# Altium footprint library Library 3D.PcbLib: 288 footprints (part 2 of 18)
Each footprint in its own frame and in the unit in brackets; x right, y up, seen from the top. Pads: shape width x height; smd on the part's side, far side on the other; paste and mask are expansions set on the pad; w line width, h text height; cw(c..) or ccw(c..) is an arc to the next point about the centre after c.
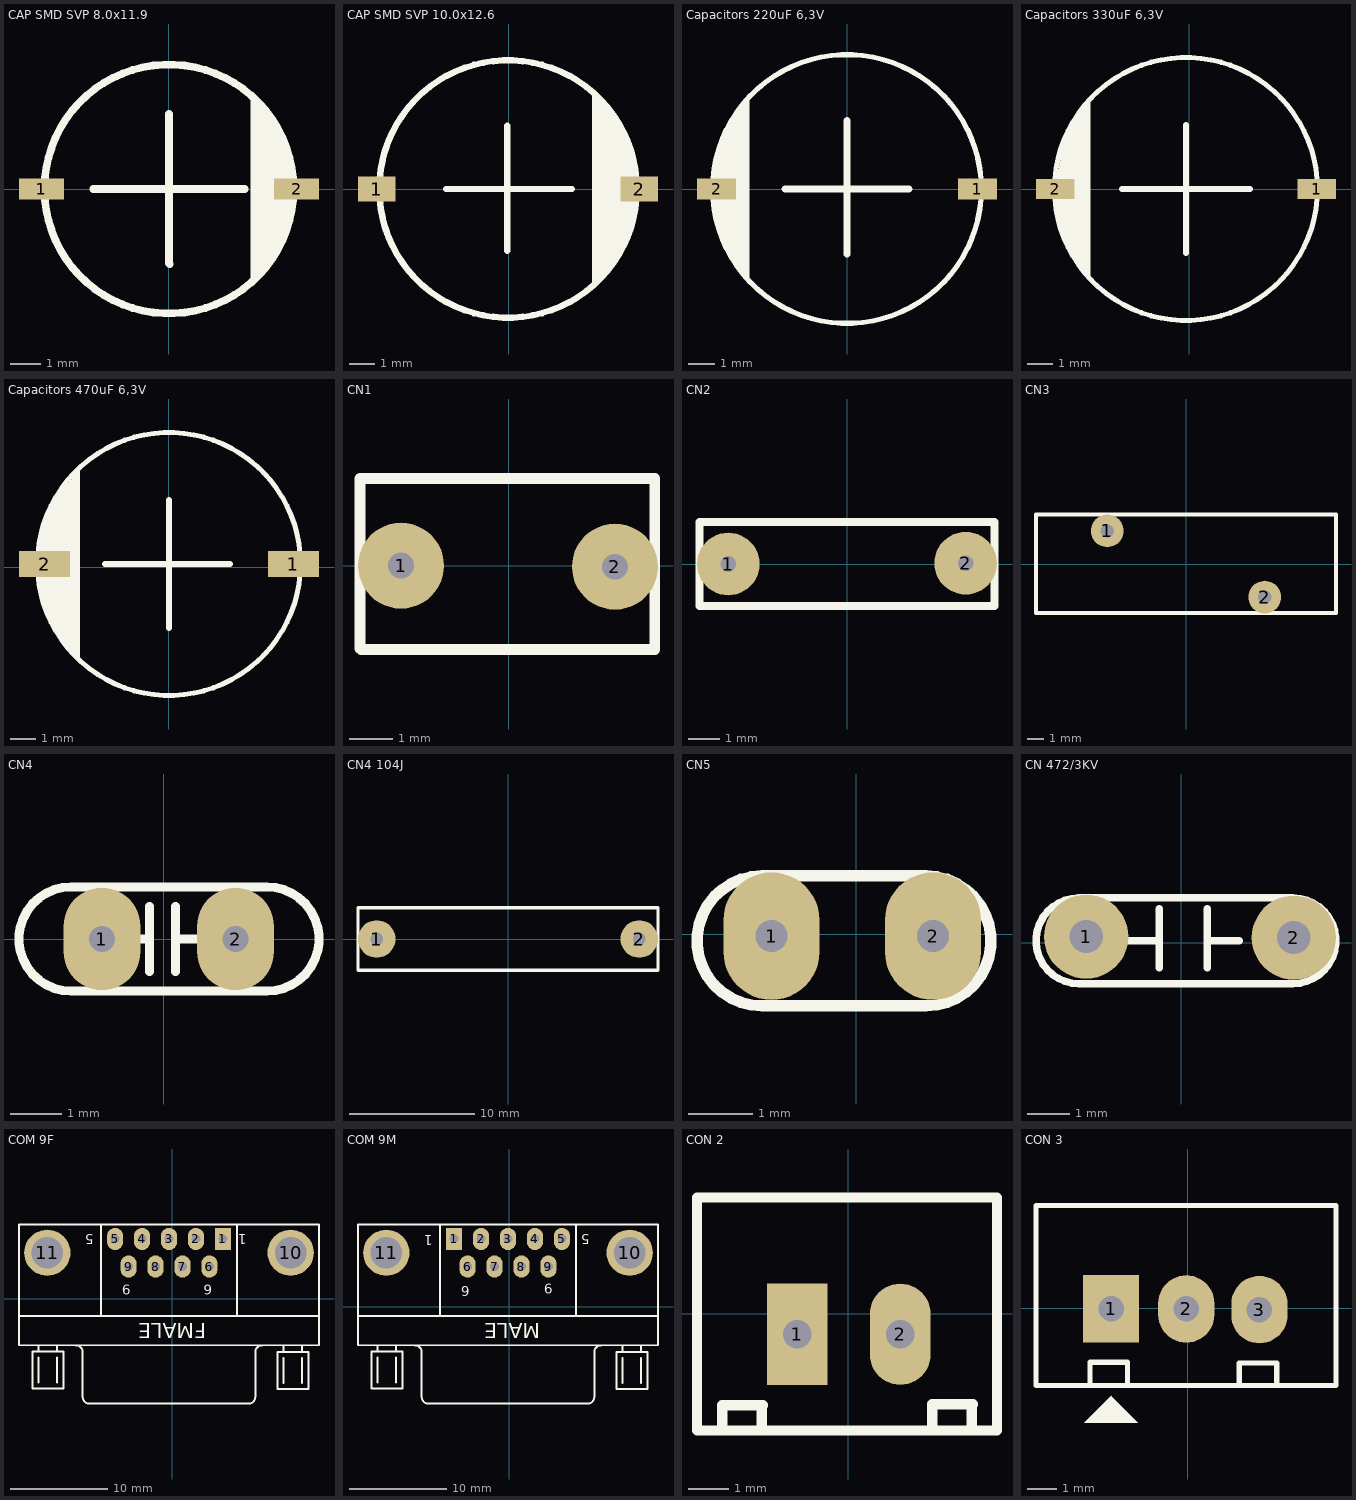
[diagram p1: the footprints below, top view; thin cyan lines are the x and y axes]

## CAP SMD SVP 8.0x11.9 [mm]
pads (2):
  rect 1.5x0.7 smd: 1(-4.25,0) 2(4.25,0)
Top Overlay:
  circle w0.254: c0,0 r4.15
  region: 2.725,3.1 2.725,-3.15 3.375,-2.45 3.875,-1.6 4.1,-0.8 4.153,0.056 4.1,0.85 3.891,1.681 3.375,2.45
  lines w0.254: -2.525,0 2.525,0 ; 0,2.5 0,-2.475 0.025,-2.5
3D body "User Library-CAP SMD SVP 8_0x11_9.STEP": height 11.9, standoff 0, extent -4.5,-4.15 4.5,4.15

## CAP SMD SVP 10.0x12.6 [mm]
pads (2):
  rect 1.5x1 smd: 1(-5.288,0) 2(5.213,0)
Top Overlay:
  circle w0.254: c-0.038,0 r5.15
  region: 3.338,3.8 3.337,-3.85 4.2,-2.987 4.788,-1.925 5.112,0 4.988,1.075 4.688,2.15 4.1,3.037
  lines w0.254: -2.513,0 2.512,0 ; -0.062,-2.475 -0.062,2.525
3D body "User Library-CAP SMD SVP 10_0x12_6.STEP": height 12.6, standoff 0, extent -5.537,-5.15 5.463,5.15

## Capacitors 220uF 6,3V [mm]
pads (2):
  rect 1.5x0.8 smd: 1(5,0) 2(-5,0)
Top Overlay:
  circle w0.2: c0,0 r5.15
  region: -3.75,3.562 -3.75,-3.5 -4.75,-2 -5.25,0 -4.721,1.985
  lines w0.254: -2.375,0 2.375,0 ; 0,-2.5 0,2.625
3D body "User Library-SMD Polymer Aluminum Electrolytic Capacitors F8 220uF 6,3V.STEP": height 7.9, standoff -0.05, extent -5.5,-5.15 5.5,5.15

## Capacitors 330uF 6,3V [mm]
pads (2):
  rect 1.5x0.8 smd: 1(5,0) 2(-5.25,0)
Top Overlay:
  circle w0.2: c-0.125,0 r5.15
  region: -3.875,3.5 -3.875,-3.5 -5,-1.875 -5.25,0 -4.875,2
  lines w0.254: -2.625,0 2.375,0 ; -0.125,-2.5 -0.125,2.5
3D body "User Library-SMD Polymer Aluminum Electrolytic Capacitors F8 330uF 6,3V.STEP": height 7.9, standoff -0.05, extent -5.625,-5.15 5.375,5.15

## Capacitors 470uF 6,3V [mm]
pads (2):
  rect 2x1 smd: 1(4.875,0.125) 2(-4.875,0.125)
Top Overlay:
  circle w0.2: c0,0.125 r5.15
  region: -3.5,-3.562 -3.5,3.812 -4.125,3.063 -4.75,2.188 -5,1.062 -5.15,0.062 -5,-0.937 -4.75,-1.937 -4.25,-2.812
  lines w0.254: -2.5,0.125 2.375,0.125 ; 0,-2.375 0,2.625
3D body "User Library-SMD Polymer Aluminum Electrolytic Capacitors F8 470uF 6,3V.STEP": height 7.9, standoff -0.05, extent -5.5,-5.025 5.5,5.275

## CN1 [mm]
pads (2):
  round 2 hole 0.6: 1(-2.5,0) 2(2.475,-0.025)
Top Overlay:
  lines w0.254: -3.45,-1.925 -3.45,2.025 3.4,2.025 3.4,-1.95 -3.425,-1.95 -3.45,-1.925
3D body "User Library-6mm radial ceramic disc capacitor.STEP": height 8.5, standoff -25.12, extent -3,-1.9 3,1.9

## CN2 [mm]
pads (2):
  round 2 hole 0.5: 1(-3.785,0) 2(3.785,0.025)
Top Overlay:
  lines w0.254: -4.699,-1.346 4.699,-1.346 4.699,1.346 -4.699,1.346 -4.699,-1.346
3D body "SW3dPS-Panasonic ECK-A3D102KBP.STEP": height 9.03, standoff -4.16, extent -4,-1.197 4.001,1.195

## CN3 [mm]
pads (2):
  round 2 hole 0.8: 1(-4.801,2.032) 2(4.801,-2.007)
Top Overlay:
  lines w0.254: -9.15,-2.974 9.15,-2.974 9.15,3.025 -9.15,3.025 -9.15,-2.974
3D body "User Library-440LD68-R.STEP": height 23.5, standoff -26.8, extent -9.15,-2.974 9.15,3.025

## CN4 [mm]
pads (2):
  oval 1.5x2 hole 0.5: 1(-1.205,0) 2(1.395,0)
Top Overlay:
  lines w0.178: -0.789,0 -0.281,0 ; -0.281,-0.635 -0.281,0.635 ; 0.227,-0.635 0.227,0.635 ; 0.227,0 0.735,0 ; -1.805,-1.016 cw(c-1.805,0) -1.805,1.016 2.005,1.016 cw(c2.005,0) 2.005,-1.016 -1.805,-1.016
3D body "cn104.STEP": height 5.97, standoff -1.95, extent -2.817,-0.848 3.021,0.848

## CN4 104J [mm]
pads (2):
  round 3 hole 1: 1(-10.5,0) 2(10.5,0)
Top Overlay:
  lines w0.254: -12,-2.5 12,-2.5 12,2.5 -12,2.5 -12,-2.5
3D body "User Library-cap-21.STEP": height 13, standoff -4, extent -11,-2.5 11,2.5

## CN5 [mm]
pads (2):
  oval 1.5x2 hole 0.5: 1(-1.325,-0.025) 2(1.2,-0.025)
Top Overlay:
  lines w0.178: 1.065,-1.116 -1.475,-1.116 cw(c-1.475,-0.1) -1.475,0.916 1.065,0.916 ; 1.09,-1.116 ccw(c1.09,-0.1) 1.09,0.916
3D body "SW3dPS-Cap 100n.STEP": height 6.73, standoff -1.19, extent -2.997,-0.862 2.841,0.834

## CN 472/3KV [mm]
pads (2):
  round 2 hole 0.787: 1(-2.25,0.15) 2(2.675,0.125)
Top Overlay:
  lines w0.178: -1.282,0.05 -0.52,0.05 ; -0.52,-0.585 -0.52,0.812 ; 0.623,-0.585 0.623,0.812 ; 0.623,0.05 1.385,0.05 ; -2.425,-0.966 cw(c-2.425,0.05) -2.425,1.066 2.655,1.066 cw(c2.655,0.05) 2.655,-0.966 -2.425,-0.966
3D body "tu hoa 5mm.step": height 10.35, standoff -2.22, extent -3.809,-1.073 4.191,1.437

## COM 9F [mm]
pads (11):
  rect 1.651x2.286 hole 0.889: 1(5.215,6.12)
  oval 1.651x2.286 hole 0.889: 2(2.445,6.12) 3(-0.325,6.12) 4(-3.095,6.12) 5(-5.865,6.12) 6(3.83,3.28) 7(1.06,3.28) 8(-1.71,3.28) 9(-4.48,3.28)
  round 4.76 hole 3.26: 10(12.17,4.7) 11(-12.82,4.7)
Top Overlay:
  lines w0.2: -15.725,-1.8 15.075,-1.8 ; -9.885,-4.805 cw(c-9.885,-5.5) -9.19,-5.5 -9.19,-10.1 ; -9.185,-10.105 ccw(c-8.49,-10.105) -8.49,-10.8 7.84,-10.8 ccw(c7.84,-10.105) 8.535,-10.105 ; -7.325,-1.8 -7.325,7.6 ; 6.675,-1.8 6.675,7.6 ; 8.54,-10.1 8.54,-5.5 cw(c9.235,-5.5) 9.235,-4.805 ; -15.725,-4.8 15.075,-4.8 15.075,7.6 -15.725,7.6 -15.725,-4.8
  lines w0.203: -13.711,-8.61 -13.711,-6.07 ; -13.711,-5.435 -13.711,-4.8 ; -11.806,-8.61 -11.806,-6.07 ; -11.806,-5.435 -11.806,-4.8 ; 11.435,-8.661 11.435,-6.121 ; 11.435,-5.486 11.435,-4.851 ; 13.34,-8.661 13.34,-6.121 ; 13.34,-5.486 13.34,-4.851 ; -14.346,-9.245 -11.171,-9.245 -11.171,-5.435 -14.346,-5.435 -14.346,-9.245 ; 10.8,-9.296 13.975,-9.296 13.975,-5.486 10.8,-5.486 10.8,-9.296
  text "FMALE" at 3.485,-2.539 h1.52
  text "6" at 4.12,1.398 h1.02
  text "9" at -4.262,1.398 h1.02
  text "5" at -8.072,6.605 h1.02
  text "1" at 7.676,6.605 h1.02
3D body "SW3dPS-9-PIN_DSUB-1.STEP": height 12.56, standoff -3.16, extent -15.781,-10.87 15.029,8.205

## COM 9M [mm]
pads (11):
  rect 1.651x2.286 hole 0.889: 1(-5.69,6.945)
  oval 1.651x2.286 hole 0.889: 2(-2.92,6.945) 3(-0.15,6.945) 4(2.62,6.945) 5(5.39,6.945) 6(-4.305,4.105) 7(-1.535,4.105) 8(1.235,4.105) 9(4.005,4.105)
  round 4.76 hole 3.26: 10(12.345,5.525) 11(-12.645,5.525)
Top Overlay:
  lines w0.2: -15.55,-0.975 15.25,-0.975 ; -9.71,-3.98 cw(c-9.71,-4.675) -9.015,-4.675 -9.015,-9.275 ; -9.01,-9.28 ccw(c-8.315,-9.28) -8.315,-9.975 8.015,-9.975 ccw(c8.015,-9.28) 8.71,-9.28 ; -7.15,-0.975 -7.15,8.425 ; 6.85,-0.975 6.85,8.425 ; 8.715,-9.275 8.715,-4.675 cw(c9.41,-4.675) 9.41,-3.98 ; -15.55,-3.975 -15.55,8.425 15.25,8.425 15.25,-3.975 -15.55,-3.975
  lines w0.203: -13.536,-7.785 -13.536,-5.245 ; -13.536,-4.61 -13.536,-3.975 ; -11.631,-7.785 -11.631,-5.245 ; -11.631,-4.61 -11.631,-3.975 ; 11.61,-7.836 11.61,-5.296 ; 11.61,-4.661 11.61,-4.026 ; 13.515,-7.836 13.515,-5.296 ; 13.515,-4.661 13.515,-4.026 ; -14.171,-8.42 -14.171,-4.61 -10.996,-4.61 -10.996,-8.42 -14.171,-8.42 ; 10.975,-8.471 10.975,-4.661 14.15,-4.661 14.15,-8.471 10.975,-8.471
  text "MALE" at 3.152,-1.714 h1.52
  text "1" at -7.897,7.303 h1.02
  text "5" at 8.232,7.43 h1.02
  text "9" at 4.422,2.35 h1.02
  text "6" at -4.087,2.096 h1.02
3D body "SW3dPS-9-PIN_DSUB.STEP": height 12.56, standoff -3.16, extent -15.644,-10.655 15.242,9.03

## CON 2 [mm]
pads (2):
  rect 1.5x2.5 hole 0.7: 1(-1.25,-0.5)
  oval 1.5x2.5 hole 0.7: 2(1.29,-0.5)
Top Overlay:
  lines w0.254: -3.1,-2.85 -3.1,-2.25 -2.1,-2.25 -2.125,-2.275 -2.125,-2.8 ; 2.075,-2.825 2.075,-2.225 3.075,-2.225 3.05,-2.25 3.05,-2.775 ; -3.725,-2.875 -3.725,2.875 3.675,2.875 3.675,-2.875 -3.725,-2.875
3D body "User Library-JST B2B-XH-A.STEP": height 7, standoff -3.4, extent -3.725,-2.875 3.675,2.875

## CON 3 [mm]
pads (3):
  rect 1.905x2.286 hole 0.864: 1(-2.6,-0.025)
  oval 1.905x2.286 hole 0.864: 2(-0.05,-0.025) 3(2.425,-0.05)
Top Overlay:
  region: -3.502,-3.872 -1.698,-3.872 -2.587,-2.983 -2.587,-2.958
  lines w0.178: -3.311,-2.59 -3.311,-1.828 -2.041,-1.828 -2.041,-2.59 ; 1.743,-2.615 1.743,-1.853 3.013,-1.853 3.013,-2.615 ; -5.14,-2.615 5.02,-2.615 5.02,-0.075 5.02,3.481 -5.14,3.481 -5.14,-2.615
3D body "User Library-B3B-XH-A.STEP": height 7, standoff -3.4, extent -5,-2.375 4.9,3.375